# Altium footprint library sun_library.PcbLib: 412 footprints (part 25 of 26)
Each footprint in its own frame and in the unit in brackets; x right, y up, seen from the top. Pads: shape width x height; smd on the part's side, far side on the other; paste and mask are expansions set on the pad; w line width, h text height; cw(c..) or ccw(c..) is an arc to the next point about the centre after c.
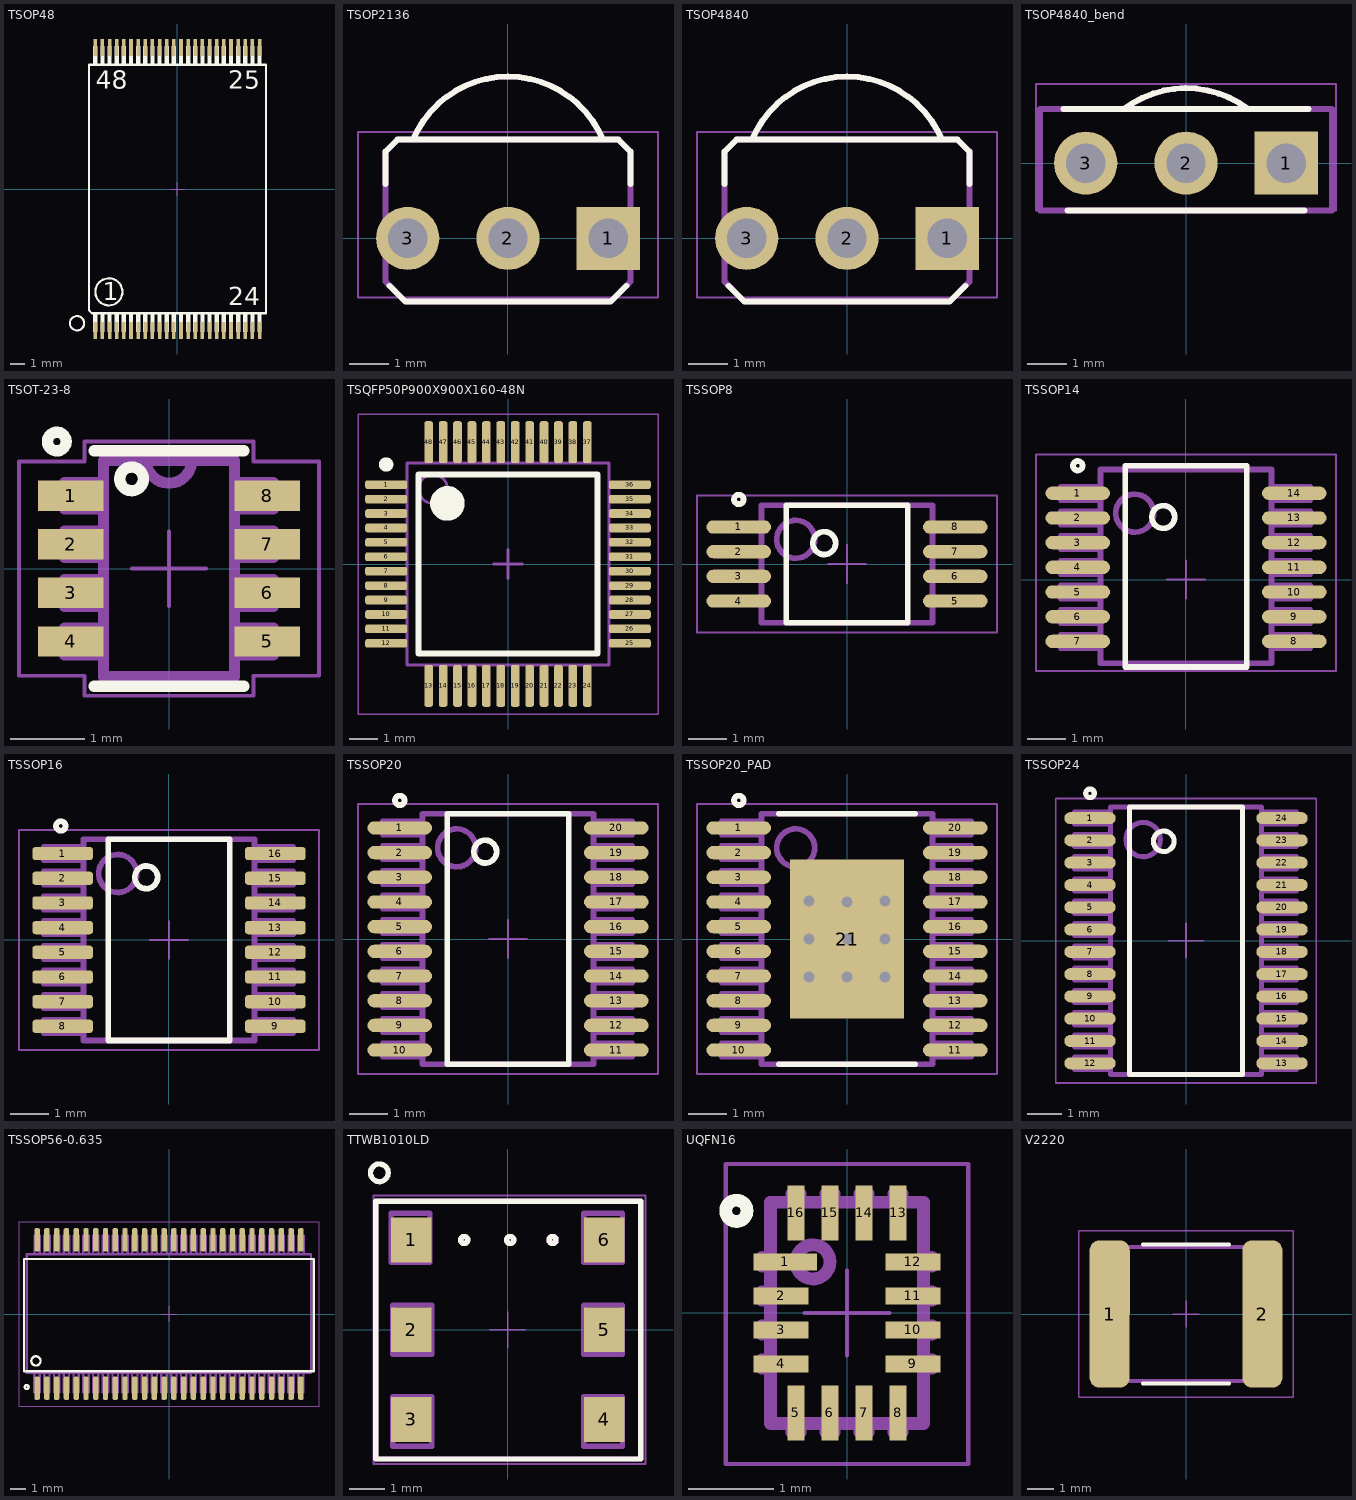
[diagram p24: the footprints below, top view; thin cyan lines are the x and y axes]

## TSOP48 [mm]
pads (48):
  rect 0.25x1.2 smd: 1(-5.75,-9.9) 2(-5.25,-9.9) 3(-4.75,-9.9) 4(-4.25,-9.9) 5(-3.75,-9.9) 6(-3.25,-9.9) 7(-2.75,-9.9) 8(-2.25,-9.9) 9(-1.75,-9.9) 10(-1.25,-9.9) 11(-0.75,-9.9) 12(-0.25,-9.9) 13(0.25,-9.9) 14(0.75,-9.9) 15(1.25,-9.9) 16(1.75,-9.9) 17(2.25,-9.9) 18(2.75,-9.9) 19(3.25,-9.9) 20(3.75,-9.9) 21(4.25,-9.9) 22(4.75,-9.9) 23(5.25,-9.9) 24(5.75,-9.9) 25(5.75,9.9) 26(5.25,9.9) 27(4.75,9.9) 28(4.25,9.9) 29(3.75,9.9) 30(3.25,9.9) 31(2.75,9.9) 32(2.25,9.9) 33(1.75,9.9) 34(1.25,9.9) 35(0.75,9.9) 36(0.25,9.9) 37(-0.25,9.9) 38(-0.75,9.9) 39(-1.25,9.9) 40(-1.75,9.9) 41(-2.25,9.9) 42(-2.75,9.9) 43(-3.25,9.9) 44(-3.75,9.9) 45(-4.25,9.9) 46(-4.75,9.9) 47(-5.25,9.9) 48(-5.75,9.9)
Top Overlay:
  circle w0.15: c-4.8,-7.2 r0.949
  circle w0.15: c-7.032,-9.397 r0.5
  rectangle: 5.6,-9.5 5.9,-8.65
  rectangle: 5.1,-9.5 5.4,-8.65
  rectangle: 4.6,-9.5 4.9,-8.65
  rectangle: 4.1,-9.5 4.4,-8.65
  rectangle: 3.6,-9.5 3.9,-8.65
  rectangle: 3.1,-9.5 3.4,-8.65
  rectangle: 2.6,-9.5 2.9,-8.65
  rectangle: 2.1,-9.5 2.4,-8.65
  rectangle: 1.6,-9.5 1.9,-8.65
  rectangle: 1.1,-9.5 1.4,-8.65
  rectangle: 0.6,-9.5 0.9,-8.65
  rectangle: 0.1,-9.5 0.4,-8.65
  rectangle: -0.4,-9.5 -0.1,-8.65
  rectangle: -0.9,-9.5 -0.6,-8.65
  rectangle: -1.4,-9.5 -1.1,-8.65
  rectangle: -1.9,-9.5 -1.6,-8.65
  rectangle: -2.4,-9.5 -2.1,-8.65
  rectangle: -2.9,-9.5 -2.6,-8.65
  rectangle: -3.4,-9.5 -3.1,-8.65
  rectangle: -3.9,-9.5 -3.6,-8.65
  rectangle: -4.4,-9.5 -4.1,-8.65
  rectangle: -4.9,-9.5 -4.6,-8.65
  rectangle: -5.4,-9.5 -5.1,-8.65
  rectangle: -5.9,-9.5 -5.6,-8.65
  rectangle: 5.6,8.65 5.9,9.5
  rectangle: 5.1,8.65 5.4,9.5
  rectangle: 4.6,8.65 4.9,9.5
  rectangle: 4.1,8.65 4.4,9.5
  rectangle: 3.6,8.65 3.9,9.5
  rectangle: 3.1,8.65 3.4,9.5
  rectangle: 2.6,8.65 2.9,9.5
  rectangle: 2.1,8.65 2.4,9.5
  rectangle: 1.6,8.65 1.9,9.5
  rectangle: 1.1,8.65 1.4,9.5
  rectangle: 0.6,8.65 0.9,9.5
  rectangle: 0.1,8.65 0.4,9.5
  rectangle: -0.4,8.65 -0.1,9.5
  rectangle: -0.9,8.65 -0.6,9.5
  rectangle: -1.4,8.65 -1.1,9.5
  rectangle: -1.9,8.65 -1.6,9.5
  rectangle: -2.4,8.65 -2.1,9.5
  rectangle: -2.9,8.65 -2.6,9.5
  rectangle: -3.4,8.65 -3.1,9.5
  rectangle: -3.9,8.65 -3.6,9.5
  rectangle: -4.4,8.65 -4.1,9.5
  rectangle: -4.9,8.65 -4.6,9.5
  rectangle: -5.4,8.65 -5.1,9.5
  rectangle: -5.9,8.65 -5.6,9.5
  rectangle: -5.9,9.15 -5.6,10
  rectangle: -5.4,9.15 -5.1,10
  rectangle: -4.9,9.15 -4.6,10
  rectangle: -4.4,9.15 -4.1,10
  rectangle: -3.9,9.15 -3.6,10
  rectangle: -3.4,9.15 -3.1,10
  rectangle: -2.9,9.15 -2.6,10
  rectangle: -2.4,9.15 -2.1,10
  rectangle: -1.9,9.15 -1.6,10
  rectangle: -1.4,9.15 -1.1,10
  rectangle: -0.9,9.15 -0.6,10
  rectangle: -0.4,9.15 -0.1,10
  rectangle: 0.1,9.15 0.4,10
  rectangle: 0.6,9.15 0.9,10
  rectangle: 1.1,9.15 1.4,10
  rectangle: 1.6,9.15 1.9,10
  rectangle: 2.1,9.15 2.4,10
  rectangle: 2.6,9.15 2.9,10
  rectangle: 3.1,9.15 3.4,10
  rectangle: 3.6,9.15 3.9,10
  rectangle: 4.1,9.15 4.4,10
  rectangle: 4.6,9.15 4.9,10
  rectangle: 5.1,9.15 5.4,10
  rectangle: 5.6,9.15 5.9,10
  rectangle: 5.6,-10 5.9,-9.15
  rectangle: 5.1,-10 5.4,-9.15
  rectangle: 4.6,-10 4.9,-9.15
  rectangle: 4.1,-10 4.4,-9.15
  rectangle: 3.6,-10 3.9,-9.15
  rectangle: 3.1,-10 3.4,-9.15
  rectangle: 2.6,-10 2.9,-9.15
  rectangle: 2.1,-10 2.4,-9.15
  rectangle: 1.6,-10 1.9,-9.15
  rectangle: 1.1,-10 1.4,-9.15
  rectangle: 0.6,-10 0.9,-9.15
  rectangle: 0.1,-10 0.4,-9.15
  rectangle: -0.4,-10 -0.1,-9.15
  rectangle: -0.9,-10 -0.6,-9.15
  rectangle: -1.4,-10 -1.1,-9.15
  rectangle: -1.9,-10 -1.6,-9.15
  rectangle: -2.4,-10 -2.1,-9.15
  rectangle: -2.9,-10 -2.6,-9.15
  rectangle: -3.4,-10 -3.1,-9.15
  rectangle: -3.9,-10 -3.6,-9.15
  rectangle: -4.4,-10 -4.1,-9.15
  rectangle: -4.9,-10 -4.6,-9.15
  rectangle: -5.4,-10 -5.1,-9.15
  rectangle: -5.9,-10 -5.6,-9.15
  lines w0.15: -6.195,-8.495 -6.195,8.695 6.195,8.695 6.195,-8.7 -5.99,-8.7 -6.195,-8.495
  text "24" at 3.569,-8.13 h1.27
  text "25" at 3.569,7.02 h1.27
  text "48" at -5.731,7.02 h1.27
  text "1" at -5.231,-7.78 h1.27
CourtTop 15:
  lines w0.05: -0.5,0 0.5,0 ; 0,-0.475 0,0.475

## TSOP2136 [mm] "TSOP2136"
height 10
pads (3):
  rect 1.6x1.6 hole 1: 1(2.54,0)
  round 1.6 hole 1: 2(0,0) 3(-2.54,0)
Top Overlay:
  lines w0.15: -3.1,1.375 -3.1,2.2 -2.8,2.5 2.8,2.5 3.1,2.2 3.1,1.375 ; -3,-1.2 -2.6,-1.6 2.6,-1.6 3,-1.2 ; -2.403,2.501 cw(c0,1.494) 2.403,2.501
TopAssy 13:
  lines w0.15: -2.403,2.501 cw(c0,1.494) 2.403,2.501 ; -3.1,-1.1 -2.6,-1.6 2.6,-1.6 3.1,-1.1 3.1,2.2 2.8,2.5 -2.8,2.5 -3.1,2.2 -3.1,-1.1
CourtTop 15:
  lines w0.05: -0.5,0 0.5,0 ; 0,-0.475 0,0.475 ; -3.8,-1.5 -3.8,2.7 3.8,2.7 3.8,-1.5 -3.8,-1.5
3D body "User Library-TSOP34438.step": height 8.95, standoff -3.6, extent -3,-1.55 3,4.05

## TSOP4840 [mm] "TSOP4840"
height 10
pads (3):
  rect 1.6x1.6 hole 1: 1(2.54,0)
  round 1.6 hole 1: 2(0,0) 3(-2.54,0)
Top Overlay:
  lines w0.15: -3.1,1.375 -3.1,2.2 -2.8,2.5 2.8,2.5 3.1,2.2 3.1,1.375 ; -3,-1.2 -2.6,-1.6 2.6,-1.6 3,-1.2 ; -2.403,2.501 cw(c0,1.494) 2.403,2.501
TopAssy 13:
  lines w0.15: -2.403,2.501 cw(c0,1.494) 2.403,2.501 ; -3.1,-1.1 -3.1,2.2 -2.8,2.5 2.8,2.5 3.1,2.2 3.1,-1.1 2.6,-1.6 -2.6,-1.6 -3.1,-1.1
CourtTop 15:
  lines w0.05: -0.5,0 0.5,0 ; 0,-0.475 0,0.475 ; -3.8,-1.5 3.8,-1.5 3.8,2.7 -3.8,2.7 -3.8,-1.5
3D body "User Library-TSOP34438.step": height 8.95, standoff -3.6, extent -3,-1.55 3,4.05

## TSOP4840_bend [mm] "TSOP4840"
height 10
pads (3):
  rect 1.6x1.6 hole 1: 1(2.54,0)
  round 1.6 hole 1: 2(0,0) 3(-2.54,0)
Top Overlay:
  lines w0.15: -3.1,1.375 3.1,1.375 ; -3,-1.2 3,-1.2 ; -1.575,1.367 cw(c0.003,-0.707) 1.561,1.382
TopAssy 13:
  lines w0.15: -1.575,1.367 cw(c0.003,-0.707) 1.561,1.382 ; -3.7,-1.2 3.7,-1.2 3.7,1.375 -3.7,1.375 -3.7,-1.2
CourtTop 15:
  lines w0.05: -0.5,0 0.5,0 ; 0,-0.475 0,0.475 ; -3.8,-1.2 3.8,-1.2 3.8,2 -3.8,2 -3.8,-1.2
3D body "User Library-IR reciver.step": height 8.22, standoff 0.43, extent -3,-12.855 3,0.25

## TSOT-23-8 [mil]
height 39.37
pads (8):
  rect 34.5x16 smd paste+0 mask+0: 1(-51.75,38.39) 2(-51.75,12.8) 3(-51.75,-12.8) 4(-51.75,-38.39) 5(51.75,-38.39) 6(51.75,-12.8) 7(51.75,12.8) 8(51.75,38.39)
Top Overlay:
  circle w5.91: c-59.06,66.93 r4.92
  circle w5.91: c-19.68,47.24 r6.23
  lines w6: -39.5,-62 39.5,-62 ; -39.5,62 39.5,62
TopAssy 13:
  lines w5.91: -12,57 ccw(c0,57) 12,57 ; -55,-45.39 -55,-31.39 -34.5,-31.39 -34.5,-45.39 -55,-45.39 ; -55,-19.8 -55,-5.8 -34.5,-5.8 -34.5,-19.8 -55,-19.8 ; -55,5.8 -55,19.8 -34.5,19.8 -34.5,5.8 -55,5.8 ; -55,31.39 -55,45.39 -34.5,45.39 -34.5,31.39 -55,31.39 ; -34.5,-57 34.5,-57 34.5,57 -34.5,57 -34.5,-57 ; 34.5,-45.39 34.5,-31.39 55,-31.39 55,-45.39 34.5,-45.39 ; 34.5,-19.8 34.5,-5.8 55,-5.8 55,-19.8 34.5,-19.8 ; 34.5,5.8 34.5,19.8 55,19.8 55,5.8 34.5,5.8 ; 34.5,31.39 34.5,45.39 55,45.39 55,31.39 34.5,31.39
CourtTop 15:
  lines w1.97: -19.68,0 19.69,0 ; 0,-19.68 0,19.68 ; -79,-56.39 -79,56.39 -44.5,56.39 -44.5,67 44.5,67 44.5,56.39 79,56.39 79,-56.39 44.5,-56.39 44.5,-67 -44.5,-67 -44.5,-56.39 -79,-56.39
3D body: height 10, standoff 0, extent 0,0 10,10
3D body "User Library-TSOT-23-8-1.STEP": height 39.37, standoff 0, extent -55.11,-57.09 55.12,57.09

## TSQFP50P900X900X160-48N [mm] "TSQFP, 48-Leads, Body 7,00x7,00mm, Pitch 0,50mm, IPC Medium Density"
height 1.6
pads (48):
  rrect50% 1.45x0.3 smd mask+0.05: 1(-4.225,2.75) 2(-4.225,2.25) 3(-4.225,1.75) 4(-4.225,1.25) 5(-4.225,0.75) 6(-4.225,0.25) 7(-4.225,-0.25) 8(-4.225,-0.75) 9(-4.225,-1.25) 10(-4.225,-1.75) 11(-4.225,-2.25) 12(-4.225,-2.75) 25(4.225,-2.75) 26(4.225,-2.25) 27(4.225,-1.75) 28(4.225,-1.25) 29(4.225,-0.75) 30(4.225,-0.25) 31(4.225,0.25) 32(4.225,0.75) 33(4.225,1.25) 34(4.225,1.75) 35(4.225,2.25) 36(4.225,2.75)
  rrect50% 0.3x1.45 smd mask+0.05: 13(-2.75,-4.225) 14(-2.25,-4.225) 15(-1.75,-4.225) 16(-1.25,-4.225) 17(-0.75,-4.225) 18(-0.25,-4.225) 19(0.25,-4.225) 20(0.75,-4.225) 21(1.25,-4.225) 22(1.75,-4.225) 23(2.25,-4.225) 24(2.75,-4.225) 37(2.75,4.225) 38(2.25,4.225) 39(1.75,4.225) 40(1.25,4.225) 41(0.75,4.225) 42(0.25,4.225) 43(-0.25,4.225) 44(-0.75,4.225) 45(-1.25,4.225) 46(-1.75,4.225) 47(-2.25,4.225) 48(-2.75,4.225)
Top Overlay:
  circle w0.25: c-4.225,3.45 r0.125
  circle w0.6: c-2.1,2.1 r0.3
  lines w0.2: -3.1,-3.1 -3.1,3.1 3.1,3.1 3.1,-3.1 -3.1,-3.1
TopAssy 13:
  circle w0.1: c-2.6,2.6 r0.5
  lines w0.1: -3.5,-3.5 -3.5,3.5 3.5,3.5 3.5,-3.5 -3.5,-3.5
CourtTop 15:
  lines w0.05: -5.2,-5.2 -5.2,5.2 5.2,5.2 5.2,-5.2 -5.2,-5.2
  lines w0.1: -0.5,0 0.5,0 ; 0,-0.5 0,0.5
3D body: height 1.6, standoff 0.15, extent -3.5,-3.5 3.5,3.5

## TSSOP8 [mm] "TSOP, 8-Leads, Body 3x4.4mm, Pitch 0.65mm, IPC Medium Density"
height 1.2
pads (8):
  oval 1.7x0.35 smd: 1(-2.85,0.975) 2(-2.85,0.325) 3(-2.85,-0.325) 4(-2.85,-0.975) 5(2.85,-0.975) 6(2.85,-0.325) 7(2.85,0.325) 8(2.85,0.975)
Top Overlay:
  circle w0.15: c-0.6,0.55 r0.3
  circle w0.15: c-2.85,1.7 r0.125
  lines w0.15: -1.6,-1.55 1.6,-1.55 1.6,1.55 -1.6,1.55 -1.6,-1.55
TopAssy 13:
  circle w0.15: c-1.35,0.65 r0.5
  lines w0.15: -2.25,-1.55 2.25,-1.55 2.25,1.55 -2.25,1.55 -2.25,-1.55
CourtTop 15:
  lines w0.05: -0.5,0 0.5,0 ; 0,-0.5 0,0.5 ; -3.95,-1.8 3.95,-1.8 3.95,1.8 -3.95,1.8 -3.95,-1.8
3D body "User Library-TSSOP8.step": height 1.2, standoff 0, extent -3.25,-1.55 3.25,1.55

## TSSOP14 [mm] "TSOP, 14-Leads, Body 5.0x4.4mm, Pitch 0.65mm, IPC Medium Density"
height 1.1
pads (14):
  oval 1.7x0.35 smd: 1(-2.85,2.275) 2(-2.85,1.625) 3(-2.85,0.975) 4(-2.85,0.325) 5(-2.85,-0.325) 6(-2.85,-0.975) 7(-2.85,-1.625) 8(2.85,-1.625) 9(2.85,-0.975) 10(2.85,-0.325) 11(2.85,0.325) 12(2.85,0.975) 13(2.85,1.625) 14(2.85,2.275)
Top Overlay:
  circle w0.15: c-0.6,1.65 r0.3
  circle w0.15: c-2.85,3 r0.125
  lines w0.15: -1.6,-2.3 1.6,-2.3 1.6,3 -1.6,3 -1.6,-2.3
TopAssy 13:
  circle w0.15: c-1.35,1.75 r0.5
  lines w0.15: -2.275,-1.8 -3.3,-1.8 -3.3,-1.45 -2.275,-1.45 ; -2.275,-1.15 -3.3,-1.15 -3.3,-0.8 -2.275,-0.8 ; -2.275,-0.5 -3.3,-0.5 -3.3,-0.15 -2.275,-0.15 ; -2.275,0.15 -3.3,0.15 -3.3,0.5 -2.275,0.5 ; -2.275,0.8 -3.3,0.8 -3.3,1.15 -2.275,1.15 ; -2.275,1.45 -3.3,1.45 -3.3,1.8 -2.275,1.8 ; 2.25,-1.8 3.275,-1.8 3.275,-1.45 2.25,-1.45 ; 2.25,-1.15 3.275,-1.15 3.275,-0.8 2.25,-0.8 ; 2.25,-0.5 3.275,-0.5 3.275,-0.15 2.25,-0.15 ; 2.25,0.15 3.275,0.15 3.275,0.5 2.25,0.5 ; 2.25,0.8 3.275,0.8 3.275,1.15 2.25,1.15 ; 2.25,1.45 3.275,1.45 3.275,1.8 2.25,1.8 ; 2.25,2.1 3.275,2.1 3.275,2.45 2.25,2.45 ; -3.3,2.1 -2.275,2.1 -3.3,2.1 ; -3.3,2.1 -3.3,2.45 ; -3.3,2.1 -3.3,2.45 ; -3.3,2.45 -2.275,2.45 -3.3,2.45 ; -2.25,-2.2 2.25,-2.2 2.25,2.9 -2.25,2.9 -2.25,-2.2
CourtTop 15:
  lines w0.05: -0.5,0 0.5,0 ; 0,-0.5 0,0.5 ; -3.95,-2.4 3.95,-2.4 3.95,3.3 -3.95,3.3 -3.95,-2.4
3D body "User Library-TSSOP-14.STEP": height 1.2, standoff 0, extent -3.2,-2.175 3.2,2.825

## TSSOP16 [mm] "TSOP, 16-Leads, Body 6.5x4.4mm, Pitch 0.65mm, IPC Medium Density"
height 1.1
pads (16):
  rrect50% 1.6x0.35 smd mask+0.07: 1(-2.8,2.275) 2(-2.8,1.625) 3(-2.8,0.975) 4(-2.8,0.325) 5(-2.8,-0.325) 6(-2.8,-0.975) 7(-2.8,-1.625) 8(-2.8,-2.275) 9(2.8,-2.275) 10(2.8,-1.625) 11(2.8,-0.975) 12(2.8,-0.325) 13(2.8,0.325) 14(2.8,0.975) 15(2.8,1.625) 16(2.8,2.275)
Top Overlay:
  circle w0.15: c-2.85,3 r0.125
  circle w0.15: c-0.6,1.65 r0.3
  lines w0.15: -1.6,-2.65 -1.6,2.65 1.6,2.65 1.6,-2.65 -1.6,-2.65
TopAssy 13:
  circle w0.15: c-1.35,1.75 r0.5
  lines w0.15: -2.275,-2.45 -3.3,-2.45 -3.3,-2.1 -2.275,-2.1 ; -2.275,-1.8 -3.3,-1.8 -3.3,-1.45 -2.275,-1.45 ; -2.275,-1.15 -3.3,-1.15 -3.3,-0.8 -2.275,-0.8 ; -2.275,-0.5 -3.3,-0.5 -3.3,-0.15 -2.275,-0.15 ; -2.275,0.15 -3.3,0.15 -3.3,0.5 -2.275,0.5 ; -2.275,0.8 -3.3,0.8 -3.3,1.15 -2.275,1.15 ; -2.275,1.45 -3.3,1.45 -3.3,1.8 -2.275,1.8 ; 2.25,-2.45 3.275,-2.45 3.275,-2.1 2.25,-2.1 ; 2.25,-1.8 3.275,-1.8 3.275,-1.45 2.25,-1.45 ; 2.25,-1.15 3.275,-1.15 3.275,-0.8 2.25,-0.8 ; 2.25,-0.5 3.275,-0.5 3.275,-0.15 2.25,-0.15 ; 2.25,0.15 3.275,0.15 3.275,0.5 2.25,0.5 ; 2.25,0.8 3.275,0.8 3.275,1.15 2.25,1.15 ; 2.25,1.45 3.275,1.45 3.275,1.8 2.25,1.8 ; 2.25,2.1 3.275,2.1 3.275,2.45 2.25,2.45 ; -3.3,2.1 -2.275,2.1 -3.3,2.1 ; -3.3,2.1 -3.3,2.45 ; -3.3,2.1 -3.3,2.45 ; -3.3,2.45 -2.275,2.45 -3.3,2.45 ; -2.25,-2.65 -2.25,2.65 2.25,2.65 2.25,-2.65 -2.25,-2.65
CourtTop 15:
  lines w0.05: -0.5,0 0.5,0 ; 0,-0.5 0,0.5 ; -3.95,-2.9 -3.95,2.9 3.95,2.9 3.95,-2.9 -3.95,-2.9
3D body "User Library-TSSOP-16-1.step": height 1.1, standoff 0, extent -3.2,-2.5 3.2,2.5

## TSSOP20 [mm] "TSOP, 20-Leads, Body 6.5x4.4mm, Pitch 0.65mm, IPC Medium Density"
height 1.1
pads (20):
  oval 1.7x0.35 smd: 1(-2.85,2.925) 2(-2.85,2.275) 3(-2.85,1.625) 4(-2.85,0.975) 5(-2.85,0.325) 6(-2.85,-0.325) 7(-2.85,-0.975) 8(-2.85,-1.625) 9(-2.85,-2.275) 10(-2.85,-2.925) 11(2.85,-2.925) 12(2.85,-2.275) 13(2.85,-1.625) 14(2.85,-0.975) 15(2.85,-0.325) 16(2.85,0.325) 17(2.85,0.975) 18(2.85,1.625) 19(2.85,2.275) 20(2.85,2.925)
Top Overlay:
  circle w0.15: c-2.85,3.65 r0.125
  circle w0.15: c-0.6,2.3 r0.3
  lines w0.15: -1.6,-3.3 -1.6,3.3 1.6,3.3 1.6,-3.3 -1.6,-3.3
TopAssy 13:
  circle w0.15: c-1.35,2.4 r0.5
  lines w0.15: -2.275,-3.1 -3.3,-3.1 -3.3,-2.75 -2.275,-2.75 ; -2.275,-2.45 -3.3,-2.45 -3.3,-2.1 -2.275,-2.1 ; -2.275,-1.8 -3.3,-1.8 -3.3,-1.45 -2.275,-1.45 ; -2.275,-1.15 -3.3,-1.15 -3.3,-0.8 -2.275,-0.8 ; -2.275,-0.5 -3.3,-0.5 -3.3,-0.15 -2.275,-0.15 ; -2.275,0.15 -3.3,0.15 -3.3,0.5 -2.275,0.5 ; -2.275,0.8 -3.3,0.8 -3.3,1.15 -2.275,1.15 ; -2.275,1.45 -3.3,1.45 -3.3,1.8 -2.275,1.8 ; -2.275,2.1 -3.3,2.1 -3.3,2.45 -2.275,2.45 ; 2.25,-2.45 3.275,-2.45 3.275,-2.1 2.25,-2.1 ; 2.25,-1.8 3.275,-1.8 3.275,-1.45 2.25,-1.45 ; 2.25,-1.15 3.275,-1.15 3.275,-0.8 2.25,-0.8 ; 2.25,-0.5 3.275,-0.5 3.275,-0.15 2.25,-0.15 ; 2.25,0.15 3.275,0.15 3.275,0.5 2.25,0.5 ; 2.25,0.8 3.275,0.8 3.275,1.15 2.25,1.15 ; 2.25,1.45 3.275,1.45 3.275,1.8 2.25,1.8 ; 2.25,2.1 3.275,2.1 3.275,2.45 2.25,2.45 ; 2.25,2.75 3.275,2.75 3.275,3.1 2.25,3.1 ; -3.3,2.75 -2.275,2.75 -3.3,2.75 ; -3.3,2.75 -3.3,3.1 ; -3.3,2.75 -3.3,3.1 ; -3.3,3.1 -2.275,3.1 -3.3,3.1 ; 3.275,-3.1 2.25,-3.1 3.275,-3.1 ; 3.275,-3.1 3.275,-2.75 ; 3.275,-3.1 3.275,-2.75 ; 3.275,-2.75 2.25,-2.75 3.275,-2.75 ; -2.25,-3.3 -2.25,3.3 2.25,3.3 2.25,-3.3 -2.25,-3.3
CourtTop 15:
  lines w0.05: -0.5,0 0.5,0 ; 0,-0.5 0,0.5 ; -3.95,-3.55 -3.95,3.55 3.95,3.55 3.95,-3.55 -3.95,-3.55
3D body "User Library-tssop-20-1.step": height 1.2, standoff 0, extent -3.3,-3.3 3.3,3.3

## TSSOP20_PAD [mm] "TSOP, 20-Leads, Body 6.5x4.4mm, Pitch 0.65mm, IPC Medium Density"
height 1.1
pads (21):
  oval 1.7x0.35 smd mask+0.075: 1(-2.85,2.925) 2(-2.85,2.275) 3(-2.85,1.625) 4(-2.85,0.975) 5(-2.85,0.325) 6(-2.85,-0.325) 7(-2.85,-0.975) 8(-2.85,-1.625) 9(-2.85,-2.275) 10(-2.85,-2.925) 11(2.85,-2.925) 12(2.85,-2.275) 13(2.85,-1.625) 14(2.85,-0.975) 15(2.85,-0.325) 16(2.85,0.325) 17(2.85,0.975) 18(2.85,1.625) 19(2.85,2.275) 20(2.85,2.925)
  rect 3x4.2 smd paste-2 mask+0.075: 21(0,0)
via -1,1 diameter 0.6 hole 0.3
via 1,1 diameter 0.6 hole 0.3
via 1,0 diameter 0.6 hole 0.3
via 0,0 diameter 0.6 hole 0.3
via -1,0 diameter 0.6 hole 0.3
via -1,-1 diameter 0.6 hole 0.3
via 0,-1 diameter 0.6 hole 0.3
via 1,-1 diameter 0.6 hole 0.3
via 0,0.975 diameter 0.6 hole 0.3
Top Overlay:
  circle w0.15: c-2.85,3.65 r0.125
  lines w0.15: -1.8,-3.3 1.8,-3.3 ; -1.8,3.3 1.8,3.3
Top Paste:
  rectangle: 0.3,-2.1 1.5,-0.325
  rectangle: -1.5,-2.1 -0.3,-0.325
  rectangle: 0.3,0.325 1.5,2.1
  rectangle: -1.5,0.325 -0.3,2.1
Bottom Solder:
  rectangle: -1.5,-2.1 1.5,2.1
TopAssy 13:
  circle w0.15: c-1.35,2.4 r0.5
  lines w0.15: -2.275,-3.1 -3.3,-3.1 -3.3,-2.75 -2.275,-2.75 ; -2.275,-2.45 -3.3,-2.45 -3.3,-2.1 -2.275,-2.1 ; -2.275,-1.8 -3.3,-1.8 -3.3,-1.45 -2.275,-1.45 ; -2.275,-1.15 -3.3,-1.15 -3.3,-0.8 -2.275,-0.8 ; -2.275,-0.5 -3.3,-0.5 -3.3,-0.15 -2.275,-0.15 ; -2.275,0.15 -3.3,0.15 -3.3,0.5 -2.275,0.5 ; -2.275,0.8 -3.3,0.8 -3.3,1.15 -2.275,1.15 ; -2.275,1.45 -3.3,1.45 -3.3,1.8 -2.275,1.8 ; -2.275,2.1 -3.3,2.1 -3.3,2.45 -2.275,2.45 ; 2.25,-2.45 3.275,-2.45 3.275,-2.1 2.25,-2.1 ; 2.25,-1.8 3.275,-1.8 3.275,-1.45 2.25,-1.45 ; 2.25,-1.15 3.275,-1.15 3.275,-0.8 2.25,-0.8 ; 2.25,-0.5 3.275,-0.5 3.275,-0.15 2.25,-0.15 ; 2.25,0.15 3.275,0.15 3.275,0.5 2.25,0.5 ; 2.25,0.8 3.275,0.8 3.275,1.15 2.25,1.15 ; 2.25,1.45 3.275,1.45 3.275,1.8 2.25,1.8 ; 2.25,2.1 3.275,2.1 3.275,2.45 2.25,2.45 ; 2.25,2.75 3.275,2.75 3.275,3.1 2.25,3.1 ; -3.3,2.75 -2.275,2.75 -3.3,2.75 ; -3.3,2.75 -3.3,3.1 ; -3.3,2.75 -3.3,3.1 ; -3.3,3.1 -2.275,3.1 -3.3,3.1 ; 3.275,-3.1 2.25,-3.1 3.275,-3.1 ; 3.275,-3.1 3.275,-2.75 ; 3.275,-3.1 3.275,-2.75 ; 3.275,-2.75 2.25,-2.75 3.275,-2.75 ; -2.25,-3.3 2.25,-3.3 2.25,3.3 -2.25,3.3 -2.25,-3.3
CourtTop 15:
  lines w0.05: -0.5,0 0.5,0 ; 0,-0.5 0,0.5 ; -3.95,-3.55 3.95,-3.55 3.95,3.55 -3.95,3.55 -3.95,-3.55
3D body "User Library-tssop-20-1.step": height 1.2, standoff 0, extent -3.3,-3.3 3.3,3.3

## TSSOP24 [mm] "TSOP, 24-Leads, Body 7,8x4,4mm (max), Pitch 0,65mm, IPC Medium Density"
height 1.2
pads (24):
  oval 1.5x0.35 smd: 1(-2.8,3.575) 2(-2.8,2.925) 3(-2.8,2.275) 4(-2.8,1.625) 5(-2.8,0.975) 6(-2.8,0.325) 7(-2.8,-0.325) 8(-2.8,-0.975) 9(-2.8,-1.625) 10(-2.8,-2.275) 11(-2.8,-2.925) 12(-2.8,-3.575) 13(2.8,-3.575) 14(2.8,-2.925) 15(2.8,-2.275) 16(2.8,-1.625) 17(2.8,-0.975) 18(2.8,-0.325) 19(2.8,0.325) 20(2.8,0.975) 21(2.8,1.625) 22(2.8,2.275) 23(2.8,2.925) 24(2.8,3.575)
Top Overlay:
  circle w0.15: c-2.8,4.3 r0.125
  circle w0.15: c-0.65,2.9 r0.3
  lines w0.15: -1.65,-3.9 -1.65,3.9 1.65,3.9 1.65,-3.9 -1.65,-3.9
TopAssy 13:
  circle w0.15: c-1.25,2.95 r0.5
  lines w0.15: -2.225,-3.75 -3.25,-3.75 -3.25,-3.4 -2.225,-3.4 ; -2.225,-3.1 -3.25,-3.1 -3.25,-2.75 -2.225,-2.75 ; -2.225,-2.45 -3.25,-2.45 -3.25,-2.1 -2.225,-2.1 ; -2.225,-1.8 -3.25,-1.8 -3.25,-1.45 -2.225,-1.45 ; -2.225,-1.15 -3.25,-1.15 -3.25,-0.8 -2.225,-0.8 ; -2.225,-0.5 -3.25,-0.5 -3.25,-0.15 -2.225,-0.15 ; -2.225,0.15 -3.25,0.15 -3.25,0.5 -2.225,0.5 ; -2.225,0.8 -3.25,0.8 -3.25,1.15 -2.225,1.15 ; -2.225,1.45 -3.25,1.45 -3.25,1.8 -2.225,1.8 ; -2.225,2.1 -3.25,2.1 -3.25,2.45 -2.225,2.45 ; -2.225,2.75 -3.25,2.75 -3.25,3.1 -2.225,3.1 ; 2.2,-3.1 3.225,-3.1 3.225,-2.75 2.2,-2.75 ; 2.2,-2.45 3.225,-2.45 3.225,-2.1 2.2,-2.1 ; 2.2,-1.8 3.225,-1.8 3.225,-1.45 2.2,-1.45 ; 2.2,-1.15 3.225,-1.15 3.225,-0.8 2.2,-0.8 ; 2.2,-0.5 3.225,-0.5 3.225,-0.15 2.2,-0.15 ; 2.2,0.15 3.225,0.15 3.225,0.5 2.2,0.5 ; 2.2,0.8 3.225,0.8 3.225,1.15 2.2,1.15 ; 2.2,1.45 3.225,1.45 3.225,1.8 2.2,1.8 ; 2.2,2.1 3.225,2.1 3.225,2.45 2.2,2.45 ; 2.2,2.75 3.225,2.75 3.225,3.1 2.2,3.1 ; 2.2,3.4 3.225,3.4 3.225,3.75 2.2,3.75 ; -3.25,3.4 -2.225,3.4 -3.25,3.4 ; -3.25,3.4 -3.25,3.75 ; -3.25,3.4 -3.25,3.75 ; -3.25,3.75 -2.225,3.75 -3.25,3.75 ; 3.225,-3.75 2.2,-3.75 3.225,-3.75 ; 3.225,-3.75 3.225,-3.4 ; 3.225,-3.75 3.225,-3.4 ; 3.225,-3.4 2.2,-3.4 3.225,-3.4 ; -2.2,-3.9 -2.2,3.9 2.2,3.9 2.2,-3.9 -2.2,-3.9
CourtTop 15:
  lines w0.05: -0.5,0 0.5,0 ; 0,-0.5 0,0.5 ; -3.8,-4.15 -3.8,4.15 3.8,4.15 3.8,-4.15 -3.8,-4.15
3D body "User Library-User Library-TSSOP-24.step": height 1.2, standoff 0, extent -3.275,-3.965 3.275,3.935

## TSSOP56-0.635 [mm] "CY7C68013A"
pads (56):
  rrect50% 0.35x1.5 smd: 1(-8.572,-4.826) 2(-7.938,-4.826) 3(-7.302,-4.826) 4(-6.667,-4.826) 5(-6.032,-4.826) 6(-5.397,-4.826) 7(-4.763,-4.826) 8(-4.127,-4.826) 9(-3.492,-4.826) 10(-2.857,-4.826) 11(-2.222,-4.826) 12(-1.587,-4.826) 13(-0.953,-4.826) 14(-0.318,-4.826) 15(0.318,-4.826) 16(0.953,-4.826) 17(1.587,-4.826) 18(2.222,-4.826) 19(2.857,-4.826) 20(3.492,-4.826) 21(4.127,-4.826) 22(4.763,-4.826) 23(5.397,-4.826) 24(6.032,-4.826) 25(6.667,-4.826) 26(7.302,-4.826) 27(7.938,-4.826) 28(8.572,-4.826) 29(8.572,4.826) 30(7.938,4.826) 31(7.302,4.826) 32(6.667,4.826) 33(6.032,4.826) 34(5.397,4.826) 35(4.763,4.826) 36(4.127,4.826) 37(3.492,4.826) 38(2.857,4.826) 39(2.222,4.826) 40(1.587,4.826) 41(0.953,4.826) 42(0.318,4.826) 43(-0.318,4.826) 44(-0.953,4.826) 45(-1.587,4.826) 46(-2.222,4.826) 47(-2.857,4.826) 48(-3.492,4.826) 49(-4.127,4.826) 50(-4.763,4.826) 51(-5.397,4.826) 52(-6.032,4.826) 53(-6.667,4.826) 54(-7.302,4.826) 55(-7.938,4.826) 56(-8.572,4.826)
Top Overlay:
  circle w0.15: c-9.25,-4.75 r0.125
  circle w0.15: c-8.65,-3.05 r0.3
  lines w0.15: -9.425,-3.725 9.4,-3.725 9.4,3.575 -9.425,3.575 -9.425,-3.725
TopAssy 13:
  drawing of 172 lines, arcs and shapes, not listed
CourtTop 15:
  lines w0.05: -0.5,0 0.5,0 ; 0,-0.5 0,0.5 ; -9.75,-6 9.75,-6 9.75,6 -9.75,6 -9.75,-6
3D body "User Library-SSOP56_3d.step": height 2, standoff -0.01, extent -9.275,-5.05 9.225,5.05

## TTWB1010LD [mm] "Coilcraft TTWB1010L RF transformer"
height 6.5
pads (6):
  rect 1.14x1.27 smd: 1(-2.73,2.54) 2(-2.73,0) 3(-2.73,-2.54) 4(2.73,-2.54) 5(2.73,0) 6(2.73,2.54)
Top Overlay:
  circle w0.15: c-3.63,4.44 r0.25
  circle w0.15: c1.27,2.54 r0.1
  circle w0.15: c0.07,2.54 r0.1
  circle w0.15: c-1.23,2.54 r0.1
  lines w0.15: -3.73,-3.66 3.77,-3.66 3.77,3.64 -3.73,3.64 -3.73,-3.66
TopAssy 13:
  circle w0.15: c-1.23,2.54 r0.1
  circle w0.15: c0.07,2.54 r0.1
  circle w0.15: c1.27,2.54 r0.1
  lines w0.15: -3.73,-3.66 -3.73,3.64 3.77,3.64 3.77,-3.66 -3.73,-3.66 ; -3.3,1.9 -2.2,1.9 -2.2,3.3 -3.3,3.3 -3.3,1.9 ; -3.25,-3.3 -3.25,-1.9 -2.15,-1.9 -2.15,-3.3 -3.25,-3.3 ; -3.25,-0.7 -3.25,0.7 -2.15,0.7 -2.15,-0.7 -3.25,-0.7 ; 2.15,-3.3 2.15,-1.9 3.25,-1.9 3.25,-3.3 2.15,-3.3 ; 2.15,-0.7 2.15,0.7 3.25,0.7 3.25,-0.7 2.15,-0.7 ; 2.15,1.9 2.15,3.3 3.25,3.3 3.25,1.9 2.15,1.9
CourtTop 15:
  lines w0.05: -0.5,0 0.5,0 ; 0,-0.5 0,0.5 ; -3.8,-3.8 3.9,-3.8 3.9,3.8 -3.8,3.8 -3.8,-3.8
3D body "Coilcraft-TTWB1010L.step": height 4.57, standoff -0.13, extent -3.289,-3.111 3.315,3.112

## UQFN16 [mm] "SON, 10-Leads, Body 3,00x3,00mm, Pitch 0,50mm, Thermal Pad 2,40x1,65mm, IPC Medium Density"
height 1
pads (16):
  rect 0.75x0.2 smd paste-0.5 mask+0.05: 1(-0.725,0.6)
  rect 0.65x0.2 smd paste-0.5 mask+0.05: 2(-0.775,0.2) 3(-0.775,-0.2) 4(-0.775,-0.6) 9(0.775,-0.6) 10(0.775,-0.2) 11(0.775,0.2) 12(0.775,0.6)
  rect 0.2x0.65 smd paste-0.5 mask+0.05: 5(-0.6,-1.175) 6(-0.2,-1.175) 7(0.2,-1.175) 8(0.6,-1.175) 13(0.6,1.175) 14(0.2,1.175) 15(-0.2,1.175) 16(-0.6,1.175)
Top Overlay:
  circle w0.15: c-1.3,1.2 r0.125
Top Paste:
  drawing of 16 lines, arcs and shapes, not listed
TopAssy 13:
  circle w0.15: c-0.4,0.6 r0.2
  lines w0.15: -1,-0.65 -1,-0.55 ; -1,-0.25 -1,-0.15 ; -1,0.15 -1,0.25 ; -1,0.55 -1,0.65 ; -0.65,-1.4 -0.55,-1.4 ; -0.65,1.4 -0.55,1.4 ; -0.25,-1.4 -0.15,-1.4 ; -0.25,1.4 -0.15,1.4 ; 0.15,-1.4 0.25,-1.4 ; 0.15,1.4 0.25,1.4 ; 0.55,-1.4 0.65,-1.4 ; 0.55,1.4 0.65,1.4 ; 1,-0.65 1,-0.55 ; 1,-0.25 1,-0.15 ; 1,0.15 1,0.25 ; 1,0.55 1,0.65 ; -0.9,-1.3 -0.9,1.3 0.9,1.3 0.9,-1.3 -0.9,-1.3
CourtTop 15:
  lines w0.05: -0.5,0 0.5,0 ; 0,-0.5 0,0.5 ; -1.425,-1.775 -1.425,1.75 1.425,1.75 1.425,-1.775 -1.425,-1.775
3D body "User Library-UQFN-16.step": height 0.6, standoff 0, extent -0.924,-1.328 0.926,1.322

## V2220 [mm] "Chip Varistor; Body 5,7 x 5.0 mm (LxW typ)"
height 2.5
pads (2):
  rrect50% 1.5x5.5 smd: 1(-2.85,0) 2(2.85,0)
Top Overlay:
  lines w0.15: -1.6,-2.6 1.6,-2.6 ; -1.6,2.6 1.6,2.6
TopAssy 13:
  lines w0.15: -2.3,-2.5 -2.3,2.5 ; 2.3,-2.5 2.3,2.5 ; -2.9,-2.5 -2.9,2.5 2.9,2.5 2.9,-2.5 -2.9,-2.5
CourtTop 15:
  lines w0.05: -0.5,0 0.5,0 ; 0,-0.5 0,0.5 ; -4,-3.1 -4,3.1 4,3.1 4,-3.1 -4,-3.1
3D body "User Library-V2220HD.STEP": height 2.5, standoff 0, extent -2.85,-2.5 2.85,2.5